# Altium footprint library Dr.Xiong_20160818.PcbLib: 266 footprints (part 11 of 17)
Each footprint in its own frame and in the unit in brackets; x right, y up, seen from the top. Pads: shape width x height; smd on the part's side, far side on the other; paste and mask are expansions set on the pad; w line width, h text height; cw(c..) or ccw(c..) is an arc to the next point about the centre after c.
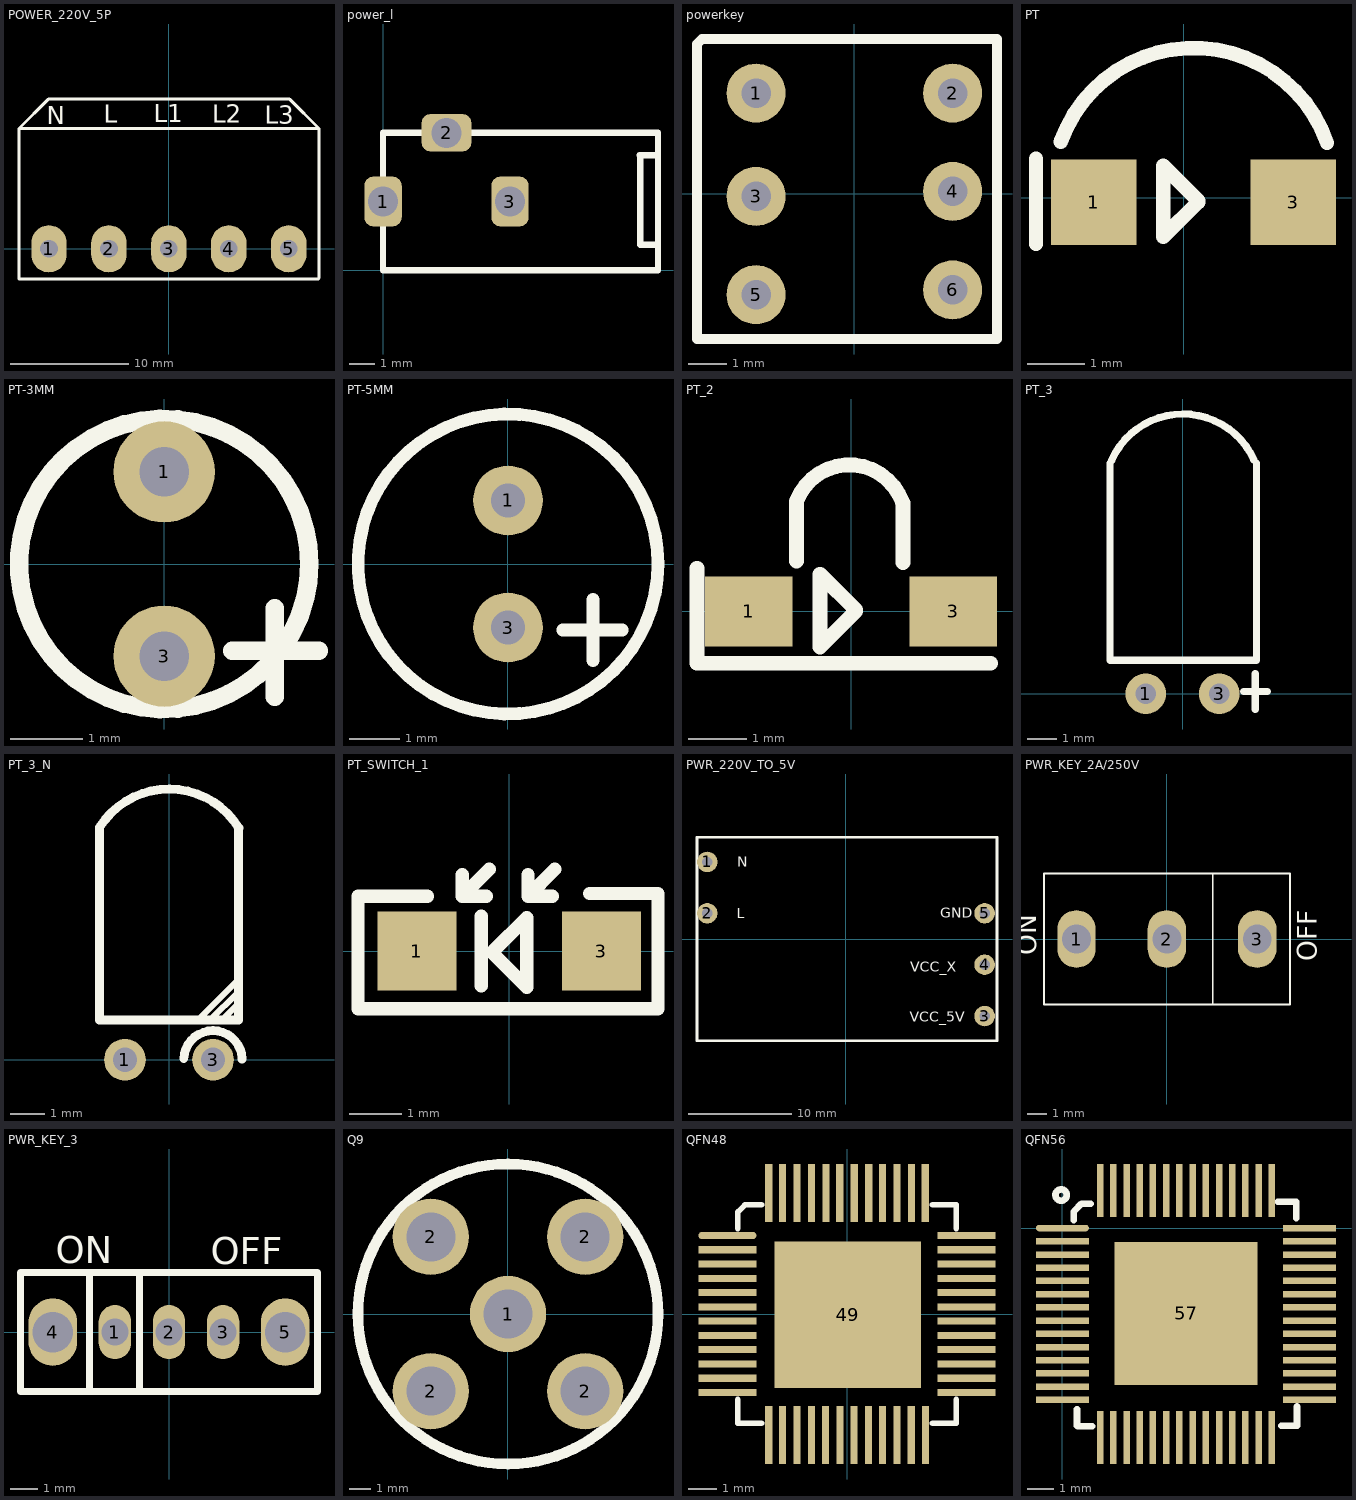
[diagram p10: the footprints below, top view; thin cyan lines are the x and y axes]

## POWER_220V_5P [mm]
pads (5):
  oval 3x4 hole 1.5: 1(-10.16,0) 2(-5.08,0) 3(0,0) 4(5.08,0) 5(10.16,0)
Top Overlay:
  lines w0.254: -12.675,10.185 2.489,10.185 ; 2.388,10.185 2.489,10.185 ; 2.565,-2.54 12.675,-2.54 12.725,-2.489 12.725,-2.286 ; 2.591,-2.54 -12.7,-2.54 -12.7,10.185 -10.211,12.675 0,12.675 10.236,12.675 ; 10.393,12.517 10.236,12.675 ; 12.7,10.185 2.489,10.185 ; 12.725,-2.438 12.725,10.185 10.236,12.675
  text "L1" at -1.295,10.719 h1.52
  text "L" at -5.512,10.668 h1.52
  text "N" at -10.363,10.566 h1.52
  text "L2" at 3.658,10.668 h1.52
  text "L3" at 8.128,10.592 h1.52

## power_l [mm]
pads (3):
  rrect50% 1.5x2 hole 1.2: 1(0,2.75) 3(5.08,2.75)
  rrect50% 2x1.5 hole 1.2: 2(2.54,5.5)
Top Overlay:
  lines w0.254: 10.871,4.597 10.262,4.597 10.287,4.572 10.287,1.016 10.947,1.016 ; 0,0 0,5.5 11,5.5 11,0 0,0

## powerkey [mil]
pads (6):
  round 60 hole 30: 1(-100,102.5) 2(100,102.5) 3(-100,-2.5) 4(100,2.5) 5(-100,-102.5) 6(100,-97.5)
Top Overlay:
  lines w10: -160,-147.5 145,-147.5 145,157.5 -155,157.5 -160,152.5 -160,-147.5

## PT [mm]
pads (2):
  rect 1.5x1.5 smd: 1(-1.575,-0.076) 3(1.925,-0.076)
Top Overlay:
  lines w0.254: -2.591,-0.813 -2.591,0.687 ; -2.155,0.984 cw(c0.178,0.152) 2.517,0.966 ; -0.356,0.559 -0.356,-0.686 0.254,-0.076 0.229,-0.076 ; -0.33,0.533 0.254,-0.051

## PT-3MM [mil]
pads (2):
  round 55 hole 27: 1(0,50) 3(0,-50)
Top Overlay:
  circle w10: c0,0 r78.74
  lines w10: 37,-47 84,-47 ; 60,-72 60,-24

## PT-5MM [mil]
pads (2):
  round 55 hole 27: 1(0,50) 3(0,-50)
Top Overlay:
  circle w10: c0,0 r118.11
  lines w10: 43,-52 90,-52 ; 67,-76 67,-28

## PT_2 [mm]
pads (2):
  rect 1.5x1.2 smd: 1(-1.75,0) 3(1.75,0)
Top Overlay:
  lines w0.254: -2.639,0.737 -2.639,-0.889 2.39,-0.889 ; -0.937,0.864 -0.937,1.88 cw(c-0.031,1.543) 0.882,1.863 ; -0.531,0.635 -0.531,-0.61 0.079,0 0.053,0 ; -0.505,0.61 0.079,0.025 ; 0.892,0.838 0.892,1.854

## PT_3 [mm]
pads (2):
  round 1.4 hole 0.7: 1(-1.27,0) 3(1.27,0)
Top Overlay:
  lines w0.254: -2.502,7.95 -2.502,1.15 2.498,1.15 ; -2.446,8.061 cw(c0.013,6.963) 2.464,8.077 ; 2.108,0.076 2.921,0.076 ; 2.515,-0.533 2.515,0.686 ; 2.553,1.15 2.553,7.95

## PT_3_N [mm]
pads (2):
  round 1.2 hole 0.7: 1(-1.27,0) 3(1.27,0)
Top Overlay:
  lines w0.178: -2,1.594 -2,1.626 ; -2,1.905 -1.981,1.905 ; -2,2.254 -2,2.362 ; 0.889,1.194 2,2.305 2,2.337 ; 1.194,1.15 1.974,1.93 2,1.93 ; 1.575,1.194 1.981,1.6 2,1.6
  lines w0.254: -2.001,6.7 cw(c0,5.436) 2.013,6.681 ; -2,6.655 -2,1.15 2,1.15 2,6.655 ; 0.427,0.028 cw(c1.268,-0.002) 2.108,0.025

## PT_SWITCH_1 [mm]
pads (2):
  rect 1.5x1.5 smd: 1(-1.75,0) 3(1.75,0)
Top Overlay:
  lines w0.254: -1.549,1.041 -2.868,1.041 -2.868,-1.092 2.822,-1.092 2.822,1.092 1.524,1.092 ; -0.889,1.448 -0.889,1.041 ; -0.533,-0.66 -0.533,0.66 ; -0.432,1.041 -0.889,1.041 ; -0.381,1.549 -0.889,1.041 ; 0.356,1.448 0.356,1.041 ; 0.813,1.041 0.356,1.041 ; 0.864,1.549 0.356,1.041 ; -0.305,-0.051 -0.305,0 0.33,0.635 0.33,-0.686 -0.305,-0.051

## PWR_220V_TO_5V [mm]
pads (5):
  round 2 hole 1: 1(-13.5,7.5) 2(-13.5,2.5) 3(13.5,-7.5) 4(13.5,-2.5) 5(13.5,2.5)
Top Overlay:
  lines w0.254: -14.5,-9.9 14.7,-9.9 14.7,9.9 -14.5,9.9 -14.5,-9.9
  text "N" at -10.566,7.036 h1
  text "L" at -10.643,2.032 h1
  text "VCC_5V" at 6.223,-8.077 h1
  text "GND" at 9.169,2.057 h1
  text "VCC_X" at 6.248,-3.175 h1

## PWR_KEY_2A/250V [mm]
pads (3):
  oval 2x3 hole 1.5: 1(-4.7,0) 2(0,0) 3(4.7,0)
Top Overlay:
  lines w0.102: 2.388,-3.4 2.388,3.378 ; 6.4,-3.4 -6.4,-3.4 -6.4,3.4 6.4,3.4 ; 6.401,-3.399 6.401,3.378
  text "ON" at -6.807,-0.838 h1
  text "OFF" at 7.798,-1.168 h1

## PWR_KEY_3 [mm]
pads (5):
  oval 1.2x2 hole 1: 1(-2,0) 2(0,0) 3(2,0)
  oval 1.8x2.5 hole 1.5: 4(-4.3,0) 5(4.3,0)
Top Overlay:
  lines w0.254: -2.997,-2.159 -2.946,-2.108 -2.946,2.159 ; -1.092,-2.108 -1.092,2.2 ; 5.436,-2.2 5.5,-2.136 5.5,2.2 -5.5,2.2 -5.5,-2.2 5.5,-2.2
  text "ON" at -4.191,2.54 h1
  text "OFF" at 1.549,2.515 h1

## Q9 [mil]
pads (5):
  round 140 hole 90: 1(0,0) 2(-141.8,-141.8) 2(-141.8,141.8) 2(141.8,-141.8) 2(141.8,141.8)
Top Overlay:
  circle w19.68: c0,0 r275.59

## QFN48 [mil]
pads (49):
  oval 80x9.84 smd: 1(-165,108.27)
  rect 80x9.84 smd: 2(-165,88.58) 3(-165,68.9) 4(-165,49.21) 5(-165,29.53) 6(-165,9.84) 7(-165,-9.84) 8(-165,-29.53) 9(-165,-49.21) 11(-165,-88.58) 12(-165,-108.27) 25(165,-108.27) 26(165,-88.58) 27(165,-68.9) 28(165,-49.21) 29(165,-29.53) 30(165,-9.84) 31(165,9.84) 32(165,29.53) 33(165,49.21) 34(165,68.9) 35(165,88.58) 36(165,108.27) 80(-165,-68.9)
  rect 9.84x80 smd: 13(-108,-167) 14(-89,-167) 15(-69,-167) 16(-49.21,-167) 17(-29.53,-167) 18(-9.84,-167) 19(9.84,-167) 20(29.53,-167) 21(49.21,-167) 22(68.9,-167) 23(88.58,-167) 24(108.27,-167) 37(108,167) 38(89,167) 39(69,167) 40(49,167) 41(30,167) 42(10,167) 43(-10,167) 44(-29,167) 45(-49,167) 46(-69,167) 47(-89,167) 48(-108,167)
  rect 202.76x202.76 smd: 49(1,-1)
Top Overlay:
  lines w7.87: -150.59,-118.11 -150.59,-150.59 -118.11,-150.59 ; -150.59,118.11 -150.59,140.75 -140.75,150.59 -118.11,150.59 ; 118.11,-150.59 150.59,-150.59 150.59,-118.11 ; 118.11,150.59 150.59,150.59 150.59,118.11

## QFN56 [mil]
pads (57):
  oval 80x9.84 smd: 1(0,0)
  rect 80x9.84 smd: 2(0,-20) 3(0,-40) 4(0,-60) 5(0,-80) 6(0,-100) 7(0,-120) 8(0,-140) 9(0,-160) 10(0,-180) 11(0,-200) 12(0,-220) 13(0,-240) 14(0,-260) 29(374,-260) 30(374,-240) 31(374,-220) 32(374,-200) 33(374,-180) 34(374,-160) 35(374,-140) 36(374,-120) 37(374,-100) 38(374,-80) 39(374,-60) 40(374,-40) 41(374,-20) 42(374,0)
  rect 9.84x80 smd: 15(57,-317) 16(77,-317) 17(97,-317) 18(117,-317) 19(137,-317) 20(157,-317) 21(177,-317) 22(197,-317) 23(217,-317) 24(237,-317) 25(257,-317) 26(277,-317) 27(297,-317) 28(317,-317) 43(317,57) 44(297,57) 45(277,57) 46(257,57) 47(237,57) 48(217,57) 49(197,57) 50(177,57) 51(157,57) 52(137,57) 53(117,57) 54(97,57) 55(77,57) 56(57,57)
  rect 216.54x216.54 smd: 57(187,-129)
Top Overlay:
  lines w10: 6.49,50.94 ccw(c-2,50) 6.54,50 ; 17,12 17,25 29,37 43,37 ; 22,-274 22,-299 23,-300 45,-300 ; 326,40 354,40 354,15 ; 331,-299 355,-299 355,-270